# Altium footprint library PCB_PASSIVE.PcbLib: 100 footprints (part 1 of 7)
Each footprint in its own frame and in the unit in brackets; x right, y up, seen from the top. Pads: shape width x height; smd on the part's side, far side on the other; paste and mask are expansions set on the pad; w line width, h text height; cw(c..) or ccw(c..) is an arc to the next point about the centre after c.
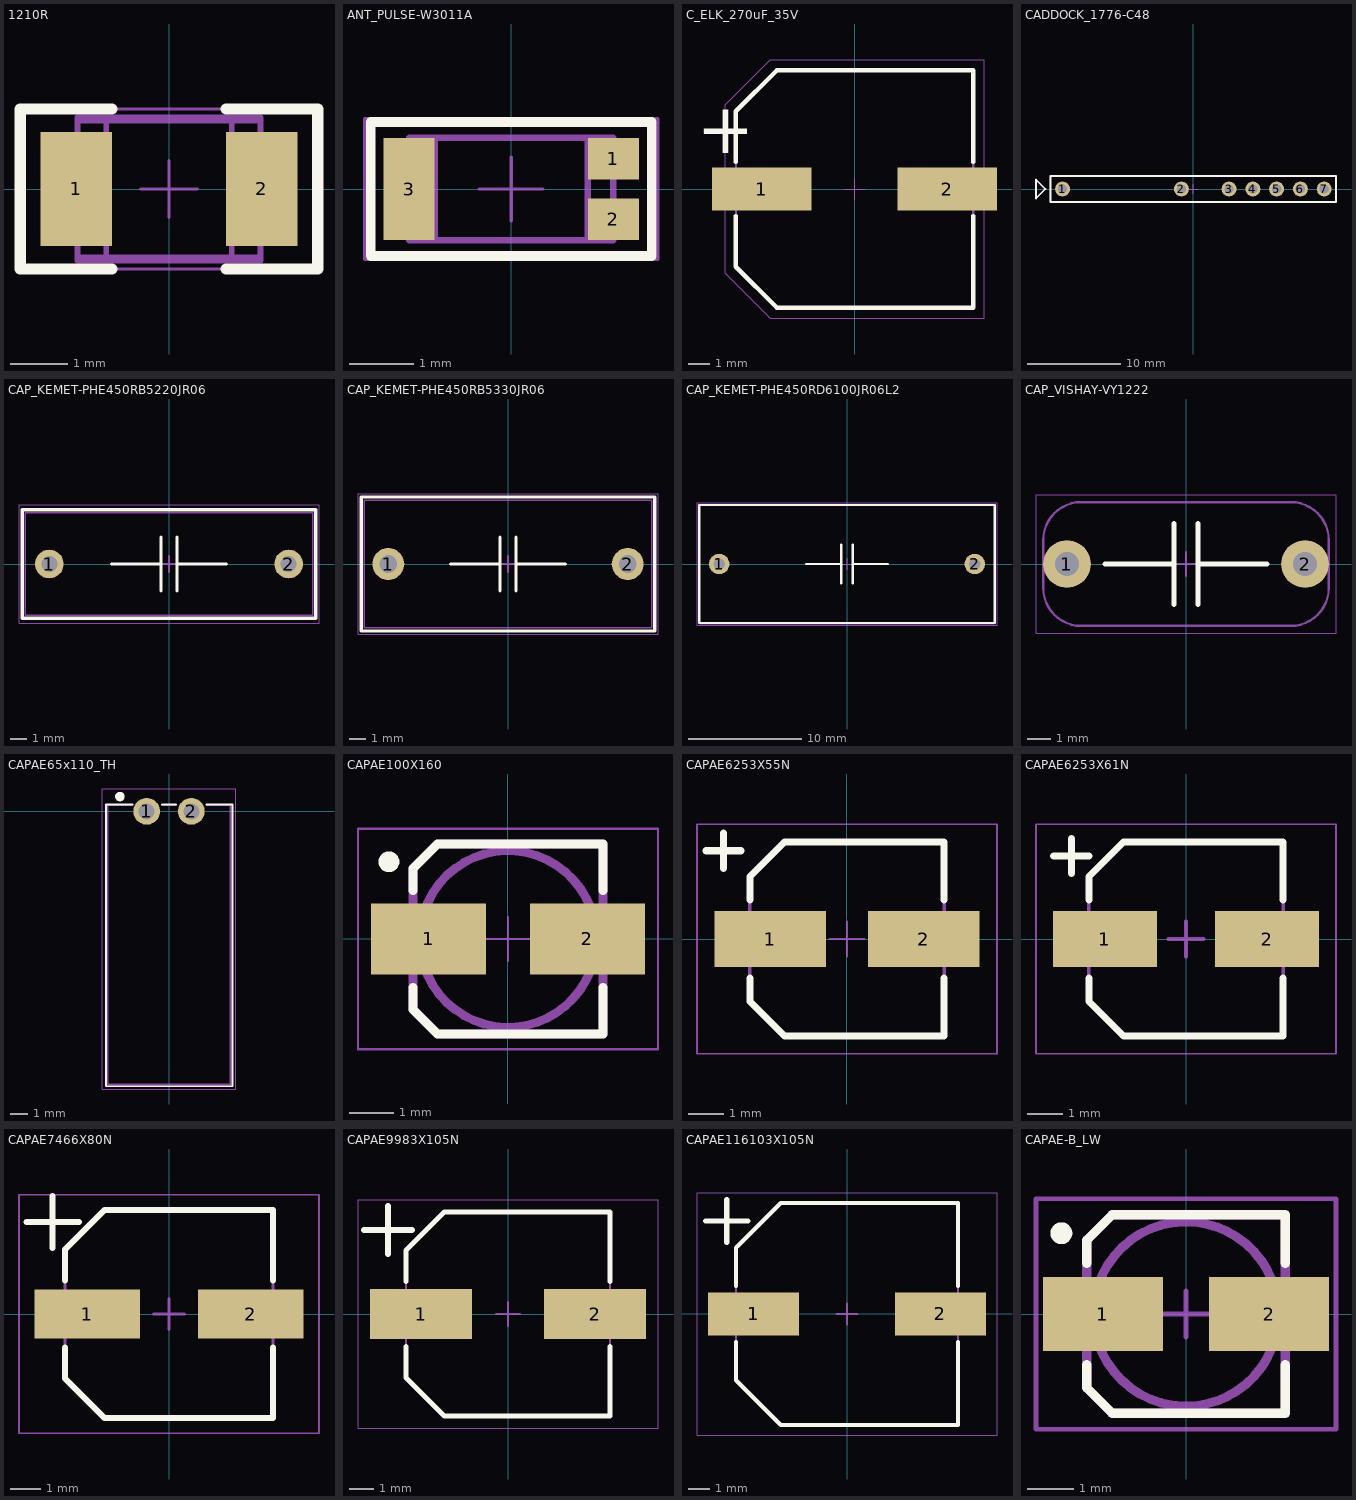
[diagram p0: the footprints below, top view; thin cyan lines are the x and y axes]

## 1210R [mm]
height 1.2
pads (2):
  rect 1.25x2 smd: 1(-1.625,0) 2(1.625,0)
Top Overlay:
  lines w0.2: -1,-1.4 -2.6,-1.4 -2.6,1.4 -1,1.4 ; 1,-1.4 2.6,-1.4 2.6,1.4 1,1.4
Mechanical 11:
  text ".Designator" at -2.55,2.05 h1
Mechanical 14:
  lines w0.1: -1.6,-1.25 1.6,-1.25 1.6,1.25 -1.6,1.25 -1.6,-1.25
Mechanical 15:
  lines w0.05: -0.5,0 0.5,0 ; 0,-0.5 0,0.5 ; -2.6,-1.4 -2.6,1.4 2.6,1.4 2.6,-1.4 -2.6,-1.4
Mechanical 17:
  lines w0.1: -1.1,-1.2 -1.1,1.2 ; 1.1,-1.2 1.1,1.2 ; -1.6,-1.2 1.6,-1.2 1.6,1.2 -1.6,1.2 -1.6,-1.2
3D body "User Library-RESC3225X06N.STEP": height 0.55, standoff 0, extent -1.6,-1.25 1.6,1.25

## ANT_PULSE-W3011A [mm]
height 1.1
pads (3):
  rect 0.8x0.65 smd: 1(1.6,0.475) 2(1.6,-0.475)
  rect 0.8x1.6 smd: 3(-1.6,0)
Top Overlay:
  lines w0.15: -2.2,-1.05 2.2,-1.05 2.2,1.05 -2.2,1.05 -2.2,-1.05
Mechanical 11:
  text ".Designator" at -1.3,-0.15 h0.3
Mechanical 14:
  lines w0.1: -1.2,-0.8 -1.2,0.8 ; 1.2,-0.8 1.2,0.8 ; -1.6,-0.8 -1.6,0.8 1.6,0.8 1.6,-0.8 -1.6,-0.8
Mechanical 15:
  lines w0.05: -0.5,0 0.5,0 ; 0,-0.5 0,0.5 ; -2.3,-1.1 2.3,-1.1 2.3,1.1 -2.3,1.1 -2.3,-1.1
3D body: height 1.1, standoff 0, extent -1.6,-0.8 1.6,0.8

## C_ELK_270uF_35V [mm]
height 10.5
pads (2):
  rect 4.6x2 smd: 1(-4.3,0) 2(4.3,0)
Top Overlay:
  lines w0.2: -5.5,-1.25 -5.5,-3.6 -3.6,-5.5 5.5,-5.5 5.5,-1.25 ; -5.5,1.25 -5.5,3.6 -3.6,5.5 5.5,5.5 5.5,1.25
  text "+" at -7.3,0.9 h4
Mechanical 11:
  text ".Designator" at -3.725,6.6 h1
Mechanical 14:
  lines w0.1: -5.5,-3.575 -3.575,-5.5 -3.55,-5.5 5.5,-5.5 5.5,5.5 -3.6,5.5 -5.5,3.6 -5.5,-3.575
Mechanical 15:
  lines w0.05: -0.5,0 0.5,0 ; 0,-0.5 0,0.5 ; -6,-3.9 -3.9,-6 6,-6 6,6 -3.9,6 -6,3.9 -6,-3.9
Mechanical 17:
  lines w0.1: -5.5,-3.6 -5.5,3.6 -3.6,5.5 5.5,5.5 5.5,-5.5 -3.6,-5.5 -5.5,-3.6

## CADDOCK_1776-C48 [mm]
height 13.5
pads (7):
  round 1.6 hole 1: 1(-13.97,0) 2(-1.27,0) 3(3.81,0) 4(6.35,0) 5(8.89,0) 6(11.43,0) 7(13.97,0)
Top Overlay:
  lines w0.2: -16.8,-1 -16.8,1 -15.8,0 -16.8,-1 ; -15.27,-1.4 -15.27,1.4 15.23,1.4 15.23,-1.4 -15.27,-1.4
Mechanical 11:
  text ".Designator" at -12.07,-0.4 h1
Mechanical 14:
  lines w0.1: -16.8,-1 -16.8,1 -15.8,0 -16.8,-1 ; -15.27,-1.4 15.23,-1.4 15.23,1.4 -15.27,1.4 -15.27,-1.4
Mechanical 15:
  lines w0.05: -15.27,-1.4 -15.27,1.4 15.23,1.4 15.23,-1.4 -15.27,-1.4
  lines w0.1: -0.5,0 0.5,0 ; 0,-0.5 0,0.5
3D body: height 13.5, standoff 0, extent -15.27,-1.4 15.23,1.4

## CAP_KEMET-PHE450RB5220JR06 [mm]
height 12.5
pads (2):
  round 1.8 hole 1: 1(-7.5,0) 2(7.5,0)
Top Overlay:
  lines w0.2: -3.6,0 -0.5,0 ; -0.5,-1.7 -0.5,0 ; -0.5,1.7 -0.5,0 ; 0.5,-1.7 0.5,0 ; 0.5,1.7 0.5,0 ; 3.6,0 0.5,0 ; -9.2,-3.4 9.2,-3.4 9.2,3.4 -9.2,3.4 -9.2,-3.4
Mechanical 11:
  text ".Designator" at -4.7,-0.5 h1
Mechanical 14:
  lines w0.1: -9,-3.2 9,-3.2 9,3.2 -9,3.2 -9,-3.2
Mechanical 15:
  lines w0.05: -9.4,-3.7 -9.4,3.7 9.4,3.7 9.4,-3.7 -9.4,-3.7
  lines w0.1: -0.5,0 0.5,0 ; 0,-0.5 0,0.5
3D body "PHE450RB5220JR06.step": height 12.51, standoff -4.99, extent -9,-3.25 9,3.251

## CAP_KEMET-PHE450RB5330JR06 [mm]
height 15
pads (2):
  round 2 hole 1.1: 1(-7.5,0) 2(7.5,0)
Top Overlay:
  lines w0.2: -3.6,0 -0.5,0 ; -0.5,-1.7 -0.5,0 ; -0.5,1.7 -0.5,0 ; 0.5,-1.7 0.5,0 ; 0.5,1.7 0.5,0 ; 3.6,0 0.5,0 ; -9.2,-4.2 9.2,-4.2 9.2,4.2 -9.2,4.2 -9.2,-4.2
Mechanical 11:
  text ".Designator" at -4.7,-0.5 h1
Mechanical 14:
  lines w0.1: -9,-4 9,-4 9,4 -9,4 -9,-4
Mechanical 15:
  lines w0.05: -9.4,-4.4 -9.4,4.4 9.4,4.4 9.4,-4.4 -9.4,-4.4
  lines w0.1: -0.5,0 0.5,0 ; 0,-0.5 0,0.5
3D body "PHE450RB5330JR06.step": height 15.01, standoff -4.99, extent -9,-4 9,4.001

## CAP_KEMET-PHE450RD6100JR06L2 [mm]
height 19
pads (2):
  round 1.8 hole 1: 1(-11.25,0) 2(11.25,0)
Top Overlay:
  lines w0.2: -3.6,0 -0.5,0 ; -0.5,-1.7 -0.5,0 ; -0.5,1.7 -0.5,0 ; 0.5,-1.7 0.5,0 ; 0.5,1.7 0.5,0 ; 3.6,0 0.5,0 ; -13,-5.2 -13,5.2 13,5.2 13,-5.2 -13,-5.2
Mechanical 11:
  text ".Designator" at -4.7,-0.5 h1
Mechanical 14:
  lines w0.1: -13,-5.25 -13,5.25 13,5.25 13,-5.25 -13,-5.25
Mechanical 15:
  lines w0.05: -13.2,-5.4 13.2,-5.4 13.2,5.4 -13.2,5.4 -13.2,-5.4
  lines w0.1: -0.5,0 0.5,0 ; 0,-0.5 0,0.5
3D body "PHE450RD6100JR06L2.step": height 19.01, standoff -4.99, extent -13,-5.25 13,5.251

## CAP_VISHAY-VY1222 [mm]
height 15
pads (2):
  round 2 hole 1: 1(-5,0) 2(5,0)
Top Overlay:
  lines w0.2: -3.4,0 -0.5,0 ; -0.5,-1.7 -0.5,0 ; -0.5,1.7 -0.5,0 ; 0.5,-1.7 0.5,0 ; 0.5,1.7 0.5,0 ; 3.4,0 0.5,0
Mechanical 11:
  text ".Designator" at -3.35,-0.3 h1
Mechanical 14:
  lines w0.1: -6,-1 ccw(c-4.4,-1) -4.4,-2.6 4.4,-2.6 ccw(c4.4,-1) 6,-1 6,1 ccw(c4.4,1) 4.4,2.6 -4.4,2.6 ccw(c-4.4,1) -6,1 -6,-1
Mechanical 15:
  lines w0.05: -6.3,-2.9 -6.3,2.9 6.3,2.9 6.3,-2.9 -6.3,-2.9
  lines w0.1: -0.5,0 0.5,0 ; 0,-0.5 0,0.5
3D body: height 15, standoff 3, extent -6,-2.5 6,2.5

## CAPAE65x110_TH [mm] "ELECTROLYTIC CAP 1.6 mm with 10 mm body size"
height 1.6
pads (2):
  round 1.5 hole 0.9: 1(-1.25,0) 2(1.25,0)
Top Overlay:
  circle w0.25: c-2.75,0.825 r0.141
  lines w0.1: -2.05,0.375 -3.525,0.375 -3.525,-15.4 3.55,-15.4 3.55,0.375 2.1,0.375 ; -0.4,0.375 0.4,0.375
Mechanical 11:
  text ".Designator" at -4.6,4.45 h1
Mechanical 14:
  lines w0.1: -2.05,0.35 -3.425,0.35 -3.425,-15.3 3.45,-15.3 3.45,0.35 2.1,0.35 ; -0.4,0.35 0.4,0.35
Mechanical 15:
  lines w0.05: -3.725,-15.55 -3.725,1.25 3.725,1.25 3.725,-15.55 -3.725,-15.55
3D body "User Library-EC6_3x11x2_5_90fok_long_duci.stp": height 3.6, standoff -3.2, extent -3.4,-15.275 3.4,0.225

## CAPAE100X160 [mm] "ELECTROLYTIC CAP 1.6 mm with 10 mm body size"
height 1.6
pads (2):
  rect 2.6x1.6 smd paste-100 mask+0.05: 1(-1.8,0) 2(1.8,0)
Top Overlay:
  circle w0.25: c-2.7,1.75 r0.112
  lines w0.2: -2.15,-1.1 -2.15,-1.6 -1.6,-2.15 2.15,-2.15 2.15,-1.1 ; -2.15,1.1 -2.15,1.6 -1.6,2.15 2.15,2.15 2.15,1.1
Top Paste:
  region: 3.1,-0.8 0.5,-0.8 0.9,-0.4 0.9,0.4 0.5,0.8 3.1,0.8
  region: -3.1,0.8 -0.5,0.8 -0.9,0.4 -0.9,-0.4 -0.5,-0.8 -3.1,-0.8
Mechanical 11:
  text ".Designator" at -2.6,-0.2 h1
Mechanical 14:
  circle w0.2: c0,0 r2
  lines w0.2: -2.15,-1.6 -1.6,-2.15 2.15,-2.15 2.15,2.15 -1.6,2.15 -2.15,1.6 -2.15,-1.6
Mechanical 15:
  lines w0.05: -0.5,0 0.5,0 ; 0,-0.5 0,0.5 ; -3.4,-2.5 -3.4,2.5 3.4,2.5 3.4,-2.5 -3.4,-2.5
3D body "ALU-B.STEP": height 5.4, standoff 0, extent -2.3,-2.15 2.3,2.15

## CAPAE6253X55N [mm] "Aluminum Electrolytic Capacitor, Body 5,30x5,30x5,50mm, IPC Medium Density"
height 5.5
pads (2):
  rect 3.15x1.6 smd: 1(-2.175,0) 2(2.175,0)
Top Overlay:
  lines w0.2: -4,2.5 -3,2.5 ; -3.5,2 -3.5,3 ; -2.75,-1.1 -2.75,-1.775 -1.775,-2.75 2.75,-2.75 2.75,-1.1 ; -2.75,1.1 -2.75,1.775 -1.775,2.75 2.75,2.75 2.75,1.1
Mechanical 11:
  text ".Designator" at -4,1 h1
Mechanical 14:
  lines w0.1: -4,2.5 -3,2.5 ; -3.5,2 -3.5,3 ; -2.75,-1.775 -2.75,1.775 -1.775,2.75 2.75,2.75 2.75,-2.75 -1.775,-2.75 -2.75,-1.775
Mechanical 15:
  lines w0.05: -0.5,0 0.5,0 ; 0,-0.5 0,0.5 ; -4.25,-3.25 4.25,-3.25 4.25,3.25 -4.25,3.25 -4.25,-3.25
3D body "CAPAE6253X55N.step": height 5.5, standoff 0, extent -3.125,-2.75 3.125,2.75

## CAPAE6253X61N [mm] "Aluminum Electrolytic Capacitor, Body 5,30x5,30x6,10mm, IPC Medium Density"
height 6.1
pads (2):
  rect 2.95x1.6 smd: 1(-2.3,0) 2(2.3,0)
Top Overlay:
  lines w0.2: -3.75,2.35 -2.75,2.35 ; -3.25,1.85 -3.25,2.85 ; -2.75,-1.1 -2.75,-1.775 -1.775,-2.75 2.75,-2.75 2.75,-1.1 ; -2.75,1.1 -2.75,1.775 -1.775,2.75 2.75,2.75 2.75,1.1
Mechanical 11:
  text ".Designator" at -2.37,-0.625 h1
Mechanical 14:
  lines w0.1: -3.75,2.35 -2.75,2.35 ; -3.25,1.85 -3.25,2.85 ; -2.75,-1.775 -1.775,-2.75 2.75,-2.75 2.75,2.75 -1.775,2.75 -2.75,1.775 -2.75,-1.775
Mechanical 15:
  lines w0.05: -4.25,-3.25 -4.25,3.25 4.25,3.25 4.25,-3.25 -4.25,-3.25
  lines w0.1: -0.5,0 0.5,0 ; 0,-0.5 0,0.5
3D body "CAPAE6253X61N.step": height 6.1, standoff 0, extent -3.125,-2.75 3.125,2.75

## CAPAE7466X80N [mm] "Aluminum Electrolytic Capacitor, Body 6,60x6,60x8,00mm, IPC Medium Density"
height 8
pads (2):
  rect 3.45x1.6 smd: 1(-2.675,0) 2(2.675,0)
Top Overlay:
  lines w0.2: -4.65,3 -2.95,3 ; -3.8,2.15 -3.8,3.85 ; -3.4,-1.1 -3.4,-2.1 -2.1,-3.4 3.4,-3.4 3.4,-1.1 ; -3.4,1.1 -3.4,2.1 -2.1,3.4 3.4,3.4 3.4,1.1
Mechanical 11:
  text ".Designator" at -3.07,-0.3 h1
Mechanical 14:
  lines w0.1: -3.4,-2.1 -2.1,-3.4 3.4,-3.4 3.4,3.4 -2.1,3.4 -3.4,2.1 -3.4,-2.1
  lines w0.15: -4.65,3 -2.95,3 ; -3.8,2.15 -3.8,3.85
Mechanical 15:
  lines w0.05: -4.9,-3.9 -4.9,3.9 4.9,3.9 4.9,-3.9 -4.9,-3.9
  lines w0.1: -0.5,0 0.5,0 ; 0,-0.5 0,0.5
3D body "CAPAE7466X80N.step": height 8, standoff 0, extent -3.7,-3.4 3.7,3.4

## CAPAE9983X105N [mm] "Aluminum Electrolytic Capacitor, Body 8,30x8,30x10,50mm, IPC Medium Density"
height 10.5
pads (2):
  rect 4.25x2.1 smd: 1(-3.625,0) 2(3.625,0)
Top Overlay:
  lines w0.2: -4.25,-1.35 -4.25,-2.65 -2.65,-4.25 4.25,-4.25 4.25,-1.35 ; -4.25,1.35 -4.25,2.65 -2.65,4.25 4.25,4.25 4.25,1.35
  lines w0.254: -6,3.5 -4,3.5 ; -5,2.5 -5,4.5
Mechanical 11:
  text ".Designator" at -2.67,-0.7 h1
Mechanical 14:
  lines w0.1: -4.25,-2.65 -4.25,2.65 -2.65,4.25 4.25,4.25 4.25,-4.25 -2.65,-4.25 -4.25,-2.65
  lines w0.15: -6,3.5 -4,3.5 ; -5,2.5 -5,4.5
Mechanical 15:
  lines w0.05: -6.25,-4.75 6.25,-4.75 6.25,4.75 -6.25,4.75 -6.25,-4.75
  lines w0.1: -0.5,0 0.5,0 ; 0,-0.5 0,0.5
3D body "CAPAE9983X105N.step": height 10.5, standoff 0, extent -4.95,-4.25 4.95,4.25

## CAPAE116103X105N [mm] "Aluminum Electrolytic Capacitor, Body 10,30x10,30x10,50mm, IPC Medium Density"
height 10.5
pads (2):
  rect 4.3x2.05 smd: 1(-4.425,0) 2(4.425,0)
Top Overlay:
  lines w0.2: -5.25,-1.325 -5.25,-3.138 -3.137,-5.25 5.25,-5.25 5.25,-1.325 ; -5.25,1.325 -5.25,3.137 -3.137,5.25 5.25,5.25 5.25,1.325
  lines w0.254: -6.7,4.4 -4.7,4.4 ; -5.7,3.4 -5.7,5.4
Mechanical 11:
  text ".Designator" at -1.2,2.7 h1
Mechanical 14:
  lines w0.1: -5.25,-3.138 -5.25,3.137 -3.137,5.25 5.25,5.25 5.25,-5.25 -3.137,-5.25 -5.25,-3.138
Mechanical 15:
  lines w0.05: -7.1,-5.75 7.1,-5.75 7.1,5.75 -7.1,5.75 -7.1,-5.75
  lines w0.1: -0.5,0 0.5,0 ; 0,-0.5 0,0.5
3D body: height 10.5, standoff 0, extent -5,-5 5,4.997
3D body: height 3.5, standoff 0, extent -5.25,-5.25 5.25,5.25

## CAPAE-B_LW [mm] "ELECTROLYTIC CAP SIZE B"
height 5.5
pads (2):
  rect 2.6x1.6 smd paste-100 mask+0.05: 1(-1.8,0) 2(1.8,0)
Top Overlay:
  circle w0.25: c-2.7,1.75 r0.112
  lines w0.2: -2.15,-1.1 -2.15,-1.6 -1.6,-2.15 2.15,-2.15 2.15,-1.1 ; -2.15,1.1 -2.15,1.6 -1.6,2.15 2.15,2.15 2.15,1.1
Top Paste:
  region: -3.1,0.8 -0.5,0.8 -0.9,0.4 -0.9,-0.4 -0.5,-0.8 -3.1,-0.8
  region: 3.1,-0.8 0.5,-0.8 0.9,-0.4 0.9,0.4 0.5,0.8 3.1,0.8
Mechanical 14:
  text ".designator" at -0.5,-0.5 h1.5
Mechanical 15:
  circle w0.2: c0,0 r2
  lines w0.2: -2.15,-1.6 -2.15,1.6 -1.6,2.15 2.15,2.15 2.15,-2.15 -1.6,-2.15 -2.15,-1.6
Mechanical 20:
  lines w0.1: -0.5,0 0.5,0 ; 0,-0.5 0,0.5 ; -3.25,-2.5 3.25,-2.5 3.25,2.5 -3.25,2.5 -3.25,-2.5
3D body "ALU-B.STEP": height 5.4, standoff 0, extent -2.3,-2.15 2.3,2.15